# Altium footprint library PcbLib1.PcbLib: 102 footprints (part 6 of 7)
Each footprint in its own frame and in the unit in brackets; x right, y up, seen from the top. Pads: shape width x height; smd on the part's side, far side on the other; paste and mask are expansions set on the pad; w line width, h text height; cw(c..) or ccw(c..) is an arc to the next point about the centre after c.
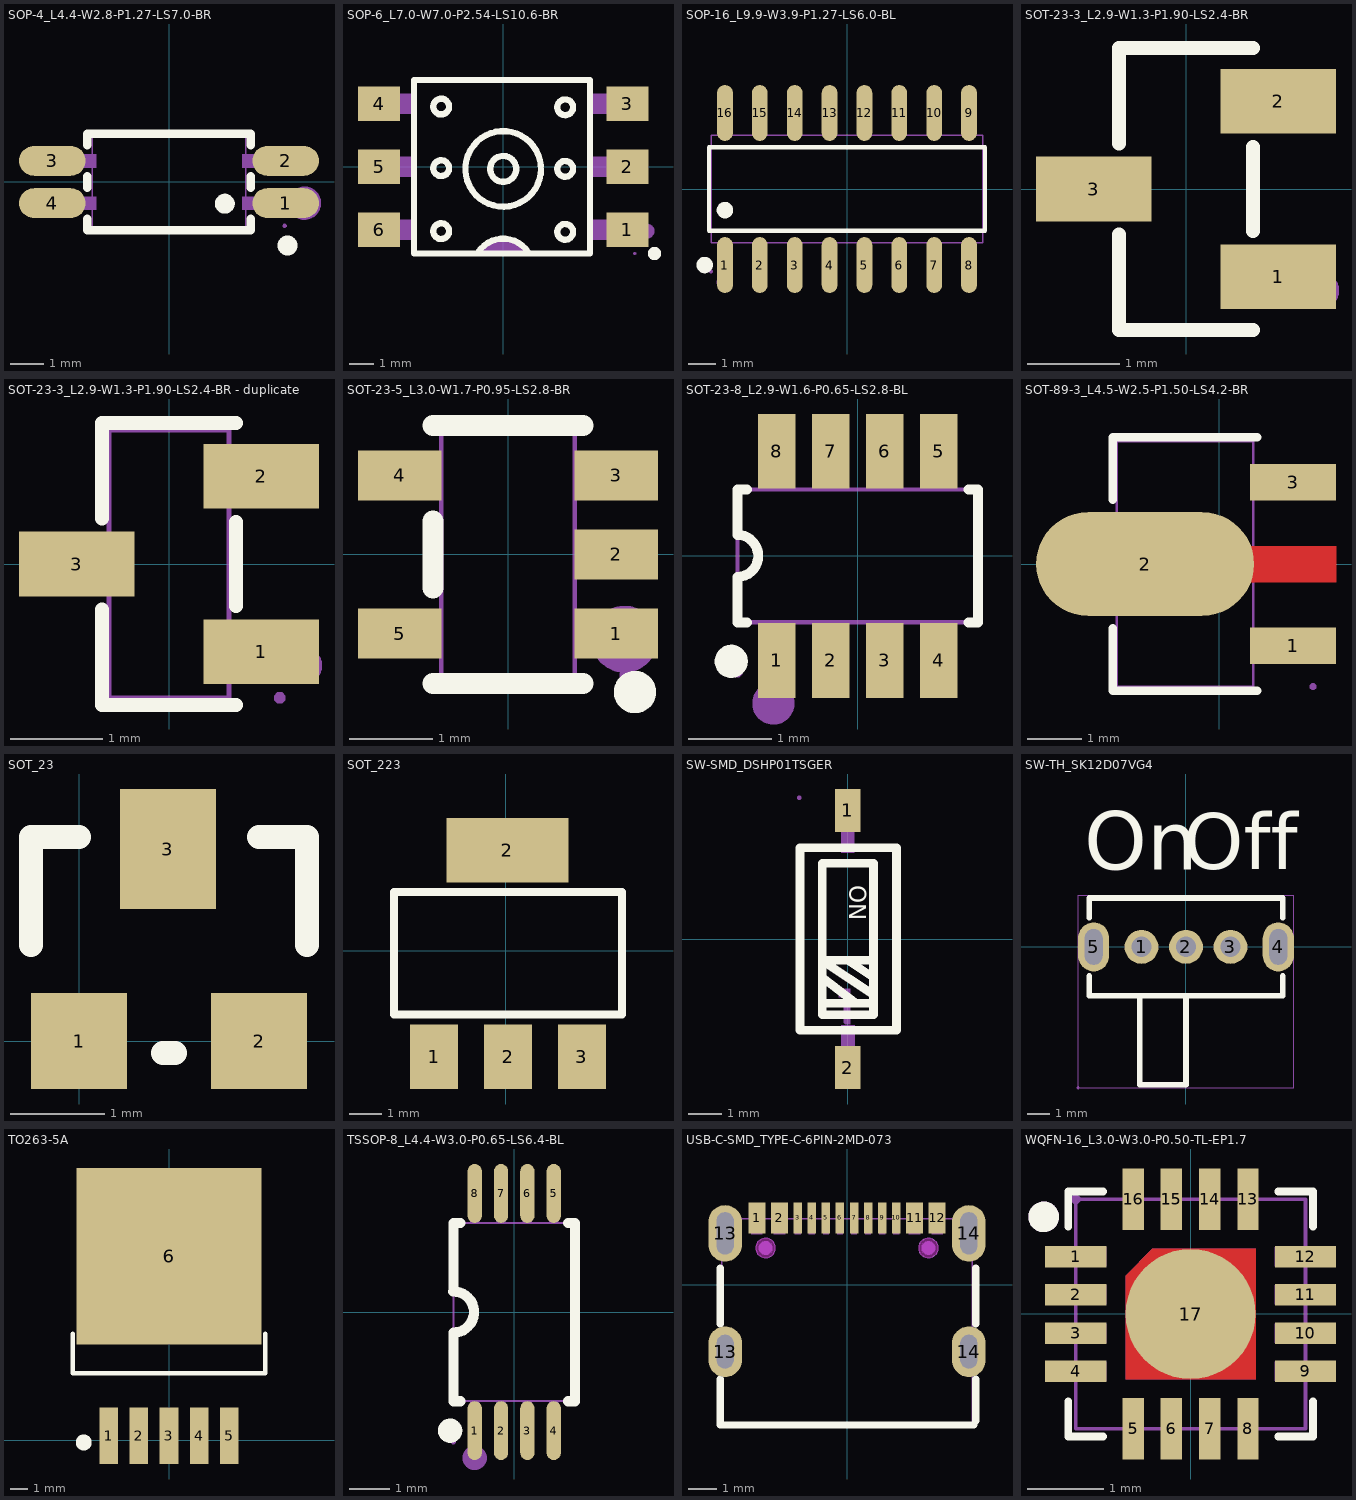
[diagram p5: the footprints below, top view; thin cyan lines are the x and y axes]

## SOP-4_L4.4-W2.8-P1.27-LS7.0-BR [mm]
pads (4):
  oval 2x0.9 smd mask+0.051: 1(3.5,-0.635) 2(3.5,0.635) 3(-3.5,0.635) 4(-3.5,-0.635)
Top Overlay:
  lines w0.254: -2.45,-1.097 -2.45,-1.45 2.45,-1.45 2.45,-1.096 ; -2.45,-0.174 -2.45,0.173 ; -2.45,1.096 -2.45,1.45 2.45,1.45 2.45,1.096 ; 2.45,-0.174 2.45,0.174
  lines w0.3: 1.672,-0.801 cw(c1.673,-0.651) 1.674,-0.801 ; 3.555,-2.055 cw(c3.556,-1.905) 3.557,-2.055
Mechanical 6:
  circle w0.5: c4.064,-0.635 r0.25
Mechanical 15:
  region: 3.53,-1.32 3.53,-1.295 3.495,-1.26 3.445,-1.26 3.41,-1.295 3.41,-1.32 3.41,-1.345 3.445,-1.38 3.495,-1.38 3.53,-1.345 3.53,-1.32
  region: -2.81,-0.835 -2.81,-0.435 -2.19,-0.435 -2.19,-0.835
  region: -3.5,-0.835 -3.5,-0.435 -2.8,-0.435 -2.8,-0.835
  region: -2.81,0.435 -2.81,0.835 -2.19,0.835 -2.19,0.435
  region: -3.5,0.435 -3.5,0.835 -2.8,0.835 -2.8,0.435
  region: 2.19,0.435 2.19,0.835 2.81,0.835 2.81,0.435
  region: 2.8,0.435 2.8,0.835 3.5,0.835 3.5,0.435
  region: 2.19,-0.835 2.19,-0.435 2.81,-0.435 2.81,-0.835
  region: 2.8,-0.835 2.8,-0.435 3.5,-0.435 3.5,-0.835
  lines w0.051: -2.3,-1.35 -2.3,1.35 2.3,1.35 2.3,-1.35 -2.3,-1.35

## SOP-6_L7.0-W7.0-P2.54-LS10.6-BR [mm]
pads (6):
  rect 1.7x1.4 smd mask+0.05: 1(5.005,-2.54) 2(5.005,0) 3(5.005,2.54) 4(-5.005,2.54) 5(-5.005,0) 6(-5.005,-2.54)
Top Overlay:
  circle w0.254: c6.1,-3.5 r0.141
  circle w0.254: c-2.5,-2.6 r0.318
  circle w0.254: c-2.5,-0.06 r0.318
  circle w0.254: c-2.5,2.424 r0.318
  circle w0.254: c2.5,2.396 r0.318
  circle w0.254: c2.5,-0.088 r0.318
  circle w0.254: c2.5,-2.628 r0.318
  lines w0.254: -1.016,-3.465 cw(c0,-4.1) 1.016,-3.465 ; 0.468,0.146 ccw(c0,-0.088) 0.508,0.039 ; 1.519,0.039 ccw(c0,-0.088) 1.524,-0.088 ; 2.256,-3.5 3.5,-3.5 3.5,3.5 -3.6,3.5 -3.6,-3.5 -3.4,-3.5 2.451,-3.5
Mechanical 6:
  circle w0.3: c5.8,-2.6 r0.15
  region: -1.016,-3.465 -0.935,-3.336 -0.714,-3.126 -0.447,-2.978 -0.152,-2.902 0.152,-2.902 0.448,-2.978 0.714,-3.126 0.935,-3.336 1.016,-3.465
Mechanical 15:
  region: 5.36,-3.5 5.36,-3.475 5.325,-3.44 5.275,-3.44 5.24,-3.475 5.24,-3.5 5.24,-3.525 5.275,-3.56 5.325,-3.56 5.36,-3.525 5.36,-3.5
  region: -4.51,-2.94 -4.51,-2.14 -3.49,-2.14 -3.49,-2.94
  region: -5.3,-2.94 -5.3,-2.14 -4.5,-2.14 -4.5,-2.94
  region: -4.51,-0.4 -4.51,0.4 -3.49,0.4 -3.49,-0.4
  region: -5.3,-0.4 -5.3,0.4 -4.5,0.4 -4.5,-0.4
  region: -4.51,2.14 -4.51,2.94 -3.49,2.94 -3.49,2.14
  region: -5.3,2.14 -5.3,2.94 -4.5,2.94 -4.5,2.14
  region: 3.49,2.14 3.49,2.94 4.51,2.94 4.51,2.14
  region: 4.5,2.14 4.5,2.94 5.3,2.94 5.3,2.14
  region: 3.49,-0.4 3.49,0.4 4.51,0.4 4.51,-0.4
  region: 4.5,-0.4 4.5,0.4 5.3,0.4 5.3,-0.4
  region: 3.49,-2.94 3.49,-2.14 4.51,-2.14 4.51,-2.94
  region: 4.5,-2.94 4.5,-2.14 5.3,-2.14 5.3,-2.94
  lines w0.051: -3.5,-3.5 -3.5,3.5 3.5,3.5 3.5,-3.5 -3.5,-3.5

## SOP-16_L9.9-W3.9-P1.27-LS6.0-BL [mm] "MAX3232"
pads (16):
  oval 0.574x2.038 smd: 1(-4.445,-2.769) 2(-3.175,-2.769) 3(-1.905,-2.769) 4(-0.635,-2.769) 5(0.635,-2.769) 6(1.905,-2.769) 7(3.175,-2.769) 8(4.445,-2.769) 9(4.445,2.769) 10(3.175,2.769) 11(1.905,2.769) 12(0.635,2.769) 13(-0.635,2.769) 14(-1.905,2.769) 15(-3.175,2.769) 16(-4.445,2.769)
Top Overlay:
  circle w0.3: c-5.184,-2.769 r0.15
  circle w0.3: c-4.445,-0.769 r0.15
  lines w0.152: -5.026,-1.521 5.026,-1.521 5.026,1.521 -5.026,1.521 -5.026,-1.521
Mechanical 6:
  circle w0.3: c-4.445,-3.4 r0.15
Mechanical 15:
  drawing of 37 lines, arcs and shapes, not listed
3D body "SOP-16.STEP": height 1.59, standoff 0.03, extent -4.95,-3 4.95,3

## SOT-23-3_L2.9-W1.3-P1.90-LS2.4-BR [mm] "静电放电(ESD)保护器件"
pads (3):
  rect 1.25x0.7 smd: 1(1,-0.95) 2(1,0.95) 3(-1,0)
Top Overlay:
  lines w0.152: -0.726,-0.495 -0.726,-1.526 0.726,-1.526 ; -0.726,0.495 -0.726,1.526 0.726,1.526 ; 0.726,-0.455 0.726,0.455
Mechanical 15:
  circle w0.2: c1.46,-1.1 r0.1
3D body "SOT-23-3.STEP": height 1.2, standoff 0, extent -1.4,-1.45 1.4,1.45

## SOT-23-3_L2.9-W1.3-P1.90-LS2.4-BR - duplicate [mm]
pads (3):
  rect 1.25x0.7 smd: 1(1,-0.95) 2(1,0.95) 3(-1,0)
Top Overlay:
  lines w0.152: -0.726,-0.495 -0.726,-1.526 0.726,-1.526 ; -0.726,0.495 -0.726,1.526 0.726,1.526 ; 0.726,-0.455 0.726,0.455
Mechanical 6:
  circle w0.2: c1.46,-1.1 r0.1
Mechanical 15:
  region: -1.2,-0.215 -1.2,0.215 -0.9,0.215 -0.9,-0.215
  region: -0.91,-0.215 -0.91,0.215 -0.64,0.215 -0.64,-0.215
  region: 0.9,-1.165 0.9,-0.735 1.2,-0.735 1.2,-1.165
  region: 0.64,-1.165 0.64,-0.735 0.91,-0.735 0.91,-1.165
  region: 0.9,0.735 0.9,1.165 1.2,1.165 1.2,0.735
  region: 0.64,0.735 0.64,1.165 0.91,1.165 0.91,0.735
  region: 1.26,-1.45 1.26,-1.425 1.225,-1.39 1.175,-1.39 1.14,-1.425 1.14,-1.45 1.14,-1.475 1.175,-1.51 1.225,-1.51 1.26,-1.475
  lines w0.051: -0.65,-1.45 0.65,-1.45 0.65,1.45 -0.65,1.45 -0.65,-1.45

## SOT-23-5_L3.0-W1.7-P0.95-LS2.8-BR [mm]
pads (5):
  rect 1x0.6 smd: 1(1.3,-0.95) 2(1.3,0) 3(1.3,0.95) 4(-1.3,0.95) 5(-1.3,-0.95)
Top Overlay:
  circle w0.254: c1.524,-1.651 r0.127
  lines w0.254: -0.9,-1.55 0.9,-1.55 ; -0.9,-0.4 -0.9,0.4 ; -0.9,1.55 0.9,1.55
Mechanical 6:
  circle w0.4: c1.397,-1.016 r0.2
Mechanical 15:
  region: 1.46,-1.45 1.46,-1.425 1.425,-1.39 1.375,-1.39 1.34,-1.425 1.34,-1.45 1.34,-1.475 1.375,-1.51 1.425,-1.51 1.46,-1.475 1.46,-1.45
  region: 0.79,-1.15 0.79,-0.75 0.96,-0.75 0.96,-1.15
  region: 0.95,-1.15 0.95,-0.75 1.4,-0.75 1.4,-1.15
  region: 0.79,-0.2 0.79,0.2 0.96,0.2 0.96,-0.2
  region: 0.95,-0.2 0.95,0.2 1.4,0.2 1.4,-0.2
  region: 0.79,0.75 0.79,1.15 0.96,1.15 0.96,0.75
  region: 0.95,0.75 0.95,1.15 1.4,1.15 1.4,0.75
  region: -0.96,0.75 -0.96,1.15 -0.79,1.15 -0.79,0.75
  region: -1.4,0.75 -1.4,1.15 -0.95,1.15 -0.95,0.75
  region: -0.96,-1.15 -0.96,-0.75 -0.79,-0.75 -0.79,-1.15
  region: -1.4,-1.15 -1.4,-0.75 -0.95,-0.75 -0.95,-1.15
  lines w0.051: -0.8,-1.45 0.8,-1.45 0.8,1.45 -0.8,1.45 -0.8,-1.45
3D body "SOT-23-5214.STEP": height 1.2, standoff -0.05, extent -1.454,-1.456 1.559,1.444

## SOT-23-8_L2.9-W1.6-P0.65-LS2.8-BL [mm]
pads (8):
  rect 0.45x0.9 smd: 1(-0.975,-1.26) 2(-0.325,-1.26) 3(0.325,-1.26) 4(0.975,-1.26) 5(0.975,1.26) 6(0.325,1.26) 7(-0.325,1.26) 8(-0.975,1.26)
Top Overlay:
  circle w0.2: c-1.524,-1.27 r0.1
  lines w0.12: -1.451,-0.255 ccw(c-1.453,-0.001) -1.45,0.254 -1.45,0.8 -1.334,0.8 ; -1.45,-0.254 -1.45,-0.8 -1.334,-0.8 ; 1.334,-0.8 1.45,-0.8 1.45,0.8 1.334,0.8
Mechanical 6:
  circle w0.254: c-1.016,-1.778 r0.127
Mechanical 15:
  region: -1.39,-1.4 -1.39,-1.375 -1.425,-1.34 -1.475,-1.34 -1.51,-1.375 -1.51,-1.4 -1.51,-1.425 -1.475,-1.46 -1.425,-1.46 -1.39,-1.425 -1.39,-1.4
  region: -1.175,-0.96 -1.175,-0.79 -0.775,-0.79 -0.775,-0.96
  region: -1.175,-1.4 -1.175,-0.95 -0.775,-0.95 -0.775,-1.4
  region: -0.525,-0.96 -0.525,-0.79 -0.125,-0.79 -0.125,-0.96
  region: -0.525,-1.4 -0.525,-0.95 -0.125,-0.95 -0.125,-1.4
  region: 0.125,-0.96 0.125,-0.79 0.525,-0.79 0.525,-0.96
  region: 0.125,-1.4 0.125,-0.95 0.525,-0.95 0.525,-1.4
  region: 0.775,-0.96 0.775,-0.79 1.175,-0.79 1.175,-0.96
  region: 0.775,-1.4 0.775,-0.95 1.175,-0.95 1.175,-1.4
  region: 0.775,0.79 0.775,0.96 1.175,0.96 1.175,0.79
  region: 0.775,0.95 0.775,1.4 1.175,1.4 1.175,0.95
  region: 0.125,0.79 0.125,0.96 0.525,0.96 0.525,0.79
  region: 0.125,0.95 0.125,1.4 0.525,1.4 0.525,0.95
  region: -0.525,0.79 -0.525,0.96 -0.125,0.96 -0.125,0.79
  region: -0.525,0.95 -0.525,1.4 -0.125,1.4 -0.125,0.95
  region: -1.175,0.79 -1.175,0.96 -0.775,0.96 -0.775,0.79
  region: -1.175,0.95 -1.175,1.4 -0.775,1.4 -0.775,0.95
  lines w0.051: -1.45,-0.8 -1.45,0.8 1.45,0.8 1.45,-0.8 -1.45,-0.8
3D body "SOT-23-8-THIN-214.STEP": height 1.05, standoff 0, extent -1.45,-1.403 1.45,1.403

## SOT-89-3_L4.5-W2.5-P1.50-LS4.2-BR [mm]
pads (3):
  rect 1.575x0.672 smd: 1(1.356,-1.5) 3(1.356,1.5)
  oval 4x1.9 smd: 2(-1.356,0)
Top Layer:
  region: -2.283,0.95 -0.429,0.95 -0.384,0.949 -0.34,0.946 -0.296,0.94 -0.252,0.933 -0.208,0.924 -0.165,0.912 -0.123,0.899 -0.081,0.884 -0.04,0.866 0,0.847 0.04,0.826 0.078,0.803 0.115,0.779 0.151,0.752 0.185,0.724 0.219,0.695 0.251,0.664 0.281,0.631 0.31,0.597 0.337,0.562 0.362,0.525 0.386,0.488 0.408,0.449 0.428,0.409 0.447,0.33 2.144,0.33 2.144,-0.33 0.447,-0.33 0.428,-0.409 0.408,-0.449 0.386,-0.488 0.362,-0.526 0.337,-0.562 0.31,-0.597 0.281,-0.631 0.251,-0.664 0.219,-0.695 0.185,-0.725 0.151,-0.753 0.115,-0.779 0.078,-0.804 0.04,-0.827 0,-0.848 -0.04,-0.867 -0.081,-0.884 -0.123,-0.899 -0.165,-0.913 -0.208,-0.924 -0.252,-0.934 -0.296,-0.941 -0.34,-0.946 -0.384,-0.949 -0.429,-0.95 -2.283,-0.95 -2.328,-0.949 -2.372,-0.946 -2.416,-0.941 -2.46,-0.934 -2.504,-0.924 -2.547,-0.913 -2.589,-0.899 -2.631,-0.884 -2.672,-0.867 -2.713,-0.848 -2.752,-0.827 -2.79,-0.804 -2.827,-0.779 -2.863,-0.753 -2.898,-0.725 -2.931,-0.695 -2.963,-0.664 -2.993,-0.631 -3.022,-0.597 -3.049,-0.562 -3.075,-0.526 -3.098,-0.488 -3.12,-0.449 -3.141,-0.409 -3.159,-0.369 -3.175,-0.327 -3.189,-0.285 -3.202,-0.242 -3.212,-0.199 -3.22,-0.155 -3.227,-0.111 -3.231,-0.067 -3.233,-0.022 -3.233,0.022 -3.231,0.067 -3.227,0.111 -3.22,0.155 -3.212,0.199 -3.202,0.242 -3.189,0.285 -3.175,0.327 -3.159,0.369 -3.141,0.409 -3.12,0.449 -3.098,0.488 -3.075,0.525 -3.049,0.562 -3.022,0.597 -2.993,0.631 -2.963,0.664 -2.931,0.695 -2.898,0.724 -2.863,0.752 -2.827,0.779 -2.79,0.803 -2.752,0.826 -2.713,0.847 -2.672,0.866 -2.631,0.884 -2.589,0.899 -2.547,0.912 -2.504,0.924 -2.46,0.933 -2.416,0.94 -2.372,0.946 -2.328,0.949
Top Overlay:
  lines w0.152: -1.95,-1.177 -1.95,-2.326 0.702,-2.326 ; -1.95,1.177 -1.95,2.326 0.702,2.326
Mechanical 6:
  circle w0.3: c1.715,-1.5 r0.15
Mechanical 15:
  region: 1.784,-2.25 1.784,-2.225 1.749,-2.19 1.699,-2.19 1.664,-2.225 1.664,-2.25 1.664,-2.275 1.699,-2.31 1.749,-2.31 1.784,-2.275 1.784,-2.25
  region: 0.439,-0.26 1.724,-0.26 1.724,0.26 0.439,0.26 -0.136,0.863 -2,0.863 -2.471,0.288 -2.471,-0.287 -2,-0.862 -0.136,-0.862
  region: 0.624,-1.25 1.724,-1.25 1.724,-1.75 0.624,-1.75
  region: 0.624,1.75 1.724,1.75 1.724,1.25 0.624,1.25
  lines w0.051: -1.874,-2.25 -1.874,2.25 0.626,2.25 0.626,-2.25 -1.874,-2.25
3D body "SOT-89214.STEP": height 1.61, standoff 0, extent -2.431,-2.141 1.669,2.159

## SOT_23 [mil]
pads (3):
  rect 40x40 smd: 1(0,0) 2(75,0)
  rect 40x50 smd: 3(37,80)
Top Overlay:
  lines w10: -20,40 -20,85 0,85 ; 35,-5 40,-5 ; 75,85 95,85 95,40
3D body "SOT-23-3.STEP": height 47.24, standoff 0, extent -19.76,-11.65 94.42,98.59

## SOT_223 [mil]
pads (4):
  rect 59x79 smd: 1(-88,-130) 2(2.55,-130) 3(93.1,-130)
  rect 150x79 smd: 2(1.88,123.54)
Top Overlay:
  lines w10: -137.45,-78 142.55,-78 142.55,72 -137.45,72 -137.45,-78
3D body "AMS1117.step": height 73.46, standoff 0.24, extent -123,-143.78 132.91,131.78

## SW-SMD_DSHP01TSGER [mm] "1.27mm开关"
pads (2):
  rect 0.76x1.27 smd paste+0 mask+0.05: 1(0,3.81) 2(0,-3.81)
Top Overlay:
  lines w0.254: -1.417,2.7 -1.417,-2.709 1.452,-2.709 1.452,-2.662 1.443,-2.662 1.443,2.709 -1.407,2.709 ; -0.761,-1.905 0.763,-1.905 ; -0.761,-1.143 0.255,-1.905 ; 0.001,-0.635 0.763,-1.143 ; 0.763,-1.651 -0.761,-0.635 0.763,-0.635 ; -0.762,-2.25 -0.762,2.25 0.762,2.25 0.762,-2.25 -0.762,-2.25
  text "ON" at 0.047,1.59 h0.49
Mechanical 6:
  region: 0.075,-1.475 0.075,-2.525 -0.075,-2.525 -0.125,-2.475 -0.125,-1.725 -0.275,-1.725 -0.275,-1.625 -0.125,-1.475
Mechanical 15:
  region: -0.2,-4.185 -0.2,-3.385 0.2,-3.385 0.2,-4.185
  region: -0.2,3.385 -0.2,4.185 0.2,4.185 0.2,3.385
  region: 0.199,-2.554 0.201,-4.187 -0.197,-4.187 -0.197,-2.559 0.199,-2.559
  region: -0.199,2.552 -0.201,4.185 0.197,4.185 0.197,2.557 -0.199,2.557
  region: -1.38,4.185 -1.38,4.21 -1.415,4.245 -1.465,4.245 -1.5,4.21 -1.5,4.185 -1.5,4.16 -1.465,4.125 -1.415,4.125 -1.38,4.16
  lines w0.051: -1.44,-2.7 1.44,-2.7 1.44,2.7 -1.44,2.7 -1.44,-2.7
3D body "SMD,2.9x5.4mm.STEP": height 2.3, standoff -0.01, extent -1.377,-4.137 1.51,4.213

## SW-TH_SK12D07VG4 [mil]
pads (5):
  round 60 hole 36: 1(-78.74,0) 2(0,0) 3(78.74,0)
  oval 55.12x86.61 hole 31.5 slot 62.99 at 90 deg: 4(163.4,0) 5(-163.39,0)
Top Overlay:
  lines w10: -171.26,86.61 171.26,86.61 171.26,51.55 ; -171.22,-51.56 -171.22,-86.57 171.3,-86.57 ; -171.22,51.56 -171.22,86.61 ; -81.69,-86.69 -81.69,-244.09 0,-244.09 0,-86.61 ; 171.26,-86.57 171.26,-51.55
  text "On" at -179.89,102.32 h177.17
  text "Off" at -4.89,104.67 h170
Mechanical 15:
  region: -64.68,0 -64.68,2.8 -66.82,7.97 -70.77,11.92 -75.94,14.06 -81.54,14.06 -86.71,11.92 -90.66,7.97 -92.8,2.8 -92.8,0 -92.8,-2.8 -90.66,-7.97 -86.71,-11.92 -81.54,-14.06 -75.94,-14.06 -70.77,-11.92 -66.82,-7.97 -64.68,-2.8 -64.68,0
  region: 14.06,0 14.06,2.8 11.92,7.97 7.97,11.92 2.8,14.06 -2.8,14.06 -7.97,11.92 -11.92,7.97 -14.06,2.8 -14.06,0 -14.06,-2.8 -11.92,-7.97 -7.97,-11.92 -2.8,-14.06 2.8,-14.06 7.97,-11.92 11.92,-7.97 14.06,-2.8 14.06,0
  region: 92.8,0 92.8,2.8 90.66,7.97 86.71,11.92 81.54,14.06 75.94,14.06 70.77,11.92 66.82,7.97 64.68,2.8 64.68,0 64.68,-2.8 66.82,-7.97 70.77,-11.92 75.94,-14.06 81.54,-14.06 86.71,-11.92 90.66,-7.97 92.8,-2.8 92.8,0
  region: 150.78,-15.75 150.78,15.75 175.98,15.75 175.98,-15.75
  region: -175.99,-15.75 -175.99,15.75 -150.79,15.75 -150.79,-15.75
  region: -188.59,-249.09 -188.59,-248.12 -189.97,-246.73 -191.93,-246.73 -193.31,-248.12 -193.31,-249.09 -193.31,-250.07 -191.93,-251.46 -189.97,-251.46 -188.59,-250.07 -188.59,-249.09
  lines w2: -190.95,-249.09 190.95,-249.09 190.95,91.61 -190.95,91.61 -190.95,-249.09
3D body "插件,P=2mm214.STEP": height 187.01, standoff -96.22, extent -169.29,-190.94 169.29,88.62

## TO263-5A [mm] "263，5脚晶体管"
pads (6):
  rect 1.05x3.2 smd: 1(-3.4,0.254) 2(-1.7,0.254) 3(0,0.254) 4(1.7,0.254) 5(3.4,0.254)
  rect 10.45x10 smd: 6(0,10.414)
Top Overlay:
  circle w0.5: c-4.826,-0.127 r0.2
  lines w0.254: -5.461,6.037 -5.461,3.787 5.461,3.787 5.461,6.037
3D body "TO263-5A.STEP": height 4.5, standoff 0, extent -5,0.244 5,13.571

## TSSOP-8_L4.4-W3.0-P0.65-LS6.4-BL [mm]
pads (8):
  oval 0.353x1.454 smd: 1(-0.975,-2.927) 2(-0.325,-2.927) 3(0.325,-2.927) 4(0.975,-2.927) 5(0.975,2.927) 6(0.325,2.927) 7(-0.325,2.927) 8(-0.975,2.927)
Top Overlay:
  circle w0.3: c-1.581,-2.927 r0.15
  lines w0.254: -1.501,0.508 cw(c-1.501,0) -1.5,-0.508 -1.5,-2.2 -1.328,-2.2 ; -1.5,0.508 -1.5,2.2 -1.328,2.2 ; 1.328,-2.2 1.5,-2.2 1.5,2.2 1.328,2.2
Mechanical 6:
  circle w0.3: c-0.975,-3.6 r0.15
Mechanical 15:
  region: -1.44,-3.2 -1.44,-3.175 -1.475,-3.14 -1.525,-3.14 -1.56,-3.175 -1.56,-3.2 -1.56,-3.225 -1.525,-3.26 -1.475,-3.26 -1.44,-3.225 -1.44,-3.2
  region: -1.085,-3.2 -1.085,-2.7 -0.865,-2.7 -0.865,-3.2
  region: -1.085,-2.71 -1.085,-2.19 -0.865,-2.19 -0.865,-2.71
  region: -0.435,-3.2 -0.435,-2.7 -0.215,-2.7 -0.215,-3.2
  region: -0.435,-2.71 -0.435,-2.19 -0.215,-2.19 -0.215,-2.71
  region: 0.215,-3.2 0.215,-2.7 0.435,-2.7 0.435,-3.2
  region: 0.215,-2.71 0.215,-2.19 0.435,-2.19 0.435,-2.71
  region: 0.865,-3.2 0.865,-2.7 1.085,-2.7 1.085,-3.2
  region: 0.865,-2.71 0.865,-2.19 1.085,-2.19 1.085,-2.71
  region: -1.085,3.2 -1.085,2.7 -0.865,2.7 -0.865,3.2
  region: -1.085,2.71 -1.085,2.19 -0.865,2.19 -0.865,2.71
  region: -0.435,3.2 -0.435,2.7 -0.215,2.7 -0.215,3.2
  region: -0.435,2.71 -0.435,2.19 -0.215,2.19 -0.215,2.71
  region: 0.215,3.2 0.215,2.7 0.435,2.7 0.435,3.2
  region: 0.215,2.71 0.215,2.19 0.435,2.19 0.435,2.71
  region: 0.865,3.2 0.865,2.7 1.085,2.7 1.085,3.2
  region: 0.865,2.71 0.865,2.19 1.085,2.19 1.085,2.71
  lines w0.051: -1.5,-2.2 -1.5,2.2 1.5,2.2 1.5,-2.2 -1.5,-2.2
3D body "TSSOP-8214.STEP": height 1.03, standoff -0.07, extent -1.5,-3.006 1.5,3.006

## USB-C-SMD_TYPE-C-6PIN-2MD-073 [mm]
pads (16):
  rect 0.6x1.1 smd paste-100 mask+0.05: 1(-3.2,2.375) 2(-2.4,2.375) 11(2.4,2.375) 12(3.2,2.375)
  rect 0.3x1.1 smd paste-100 mask+0.05: 3(-1.75,2.375) 4(-1.25,2.375) 5(-0.75,2.375) 6(-0.25,2.375) 7(0.25,2.375) 8(0.75,2.375) 9(1.25,2.375) 10(1.75,2.375)
  oval 1.2x1.8 hole 0.6 slot 1.2 at 90 deg paste+0 mask+0.05: 13(-4.325,-2.375) 14(4.325,-2.375)
  oval 1.2x2 hole 0.6 slot 1.5 at 90 deg paste+0 mask+0.05: 13(-4.325,1.825) 14(4.325,1.825)
Top Overlay:
  lines w0.254: -4.5,-3.356 -4.5,-4.975 4.5,-4.975 ; -4.5,-1.394 -4.5,0.594 ; 4.572,-4.826 4.572,-3.353 ; 4.572,-1.397 4.572,0.597
Top Paste:
  drawing of 16 lines, arcs and shapes, not listed
Keep-Out Layer:
  board cut-out: 3.24,1.305 3.24,1.375 3.187,1.503 3.088,1.602 2.96,1.655 2.821,1.655 2.692,1.602 2.593,1.503 2.54,1.375 2.54,1.305 2.54,1.235 2.593,1.107 2.692,1.008 2.821,0.955 2.96,0.955 3.088,1.008 3.187,1.107 3.24,1.235 3.24,1.305
  board cut-out: -2.54,1.305 -2.54,1.375 -2.593,1.503 -2.692,1.602 -2.82,1.655 -2.96,1.655 -3.088,1.602 -3.187,1.503 -3.24,1.375 -3.24,1.305 -3.24,1.235 -3.187,1.107 -3.088,1.008 -2.96,0.955 -2.82,0.955 -2.692,1.008 -2.593,1.107 -2.54,1.235 -2.54,1.305
Mechanical 1:
  circle w0.005: c2.89,1.305 r0.35
  circle w0.005: c-2.89,1.305 r0.35
Mechanical 6:
  circle w0.25: c2.89,1.305 r0.125
  circle w0.25: c-2.89,1.305 r0.125
Mechanical 15:
  region: 4.2,-2.025 4.45,-2.025 4.45,-2.725 4.2,-2.725
  region: -4.45,-2.025 -4.2,-2.025 -4.2,-2.725 -4.45,-2.725
  region: 4.2,2.349 4.45,2.349 4.45,1.249 4.2,1.249
  region: -4.45,2.349 -4.2,2.349 -4.2,1.249 -4.45,1.249
  region: 3,2.649 3.4,2.649 3.4,1.799 3,1.799
  region: 2.2,2.649 2.6,2.649 2.6,1.799 2.2,1.799
  region: -2.6,2.649 -2.2,2.649 -2.2,1.799 -2.6,1.799
  region: -3.4,2.649 -3,2.649 -3,1.799 -3.4,1.799
  region: 1.65,2.649 1.85,2.649 1.85,1.799 1.65,1.799
  region: 1.15,2.649 1.35,2.649 1.35,1.799 1.15,1.799
  region: 0.65,2.649 0.85,2.649 0.85,1.799 0.65,1.799
  region: 0.15,2.649 0.35,2.649 0.35,1.799 0.15,1.799
  region: -0.35,2.649 -0.15,2.649 -0.15,1.799 -0.35,1.799
  region: -1.35,2.649 -1.15,2.649 -1.15,1.799 -1.35,1.799
  region: -0.85,2.649 -0.65,2.649 -0.65,1.799 -0.85,1.799
  region: -1.85,2.649 -1.65,2.649 -1.65,1.799 -1.85,1.799
  region: -4.39,2.649 -4.39,2.674 -4.425,2.709 -4.475,2.709 -4.51,2.674 -4.51,2.649 -4.51,2.624 -4.475,2.589 -4.425,2.589 -4.39,2.624 -4.39,2.649
  lines w0.051: -4.45,-5.001 4.45,-5.001 4.45,2.349 -4.45,2.349 -4.45,-5.001
Multi-Layer keep-out:
  region: 3.24,1.305 3.24,1.375 3.187,1.503 3.088,1.602 2.96,1.655 2.821,1.655 2.692,1.602 2.593,1.503 2.54,1.375 2.54,1.305 2.54,1.235 2.593,1.107 2.692,1.008 2.821,0.955 2.96,0.955 3.088,1.008 3.187,1.107 3.24,1.235 3.24,1.305
  region: -2.54,1.305 -2.54,1.375 -2.593,1.503 -2.692,1.602 -2.82,1.655 -2.96,1.655 -3.088,1.602 -3.187,1.503 -3.24,1.375 -3.24,1.305 -3.24,1.235 -3.187,1.107 -3.088,1.008 -2.96,0.955 -2.82,0.955 -2.692,1.008 -2.593,1.107 -2.54,1.235 -2.54,1.305
3D body "typeC214.STEP": height 3.26, standoff -0.9, extent -4.47,-5.062 4.47,2.518

## WQFN-16_L3.0-W3.0-P0.50-TL-EP1.7 [mm]
pads (17):
  rect 0.8x0.28 smd paste-100 mask+0.051: 1(-1.5,0.75) 2(-1.5,0.25) 3(-1.5,-0.25) 4(-1.5,-0.75) 9(1.5,-0.75) 10(1.5,-0.25) 11(1.5,0.25) 12(1.5,0.75)
  rect 0.28x0.8 smd paste-100 mask+0.051: 5(-0.75,-1.5) 6(-0.25,-1.5) 7(0.25,-1.5) 8(0.75,-1.5) 13(0.75,1.5) 14(0.25,1.5) 15(-0.25,1.5) 16(-0.75,1.5)
  round 1.7 smd: 17(0,0)
Top Layer:
  region: 0.85,0.85 0.85,-0.85 -0.85,-0.85 -0.85,0.5 -0.5,0.85
Top Overlay:
  circle w0.2: c-1.92,1.27 r0.1
  lines w0.102: -1.6,-1.144 -1.6,-1.6 -1.144,-1.6 ; -1.6,1.144 -1.6,1.6 -1.144,1.6 ; 1.144,-1.6 1.6,-1.6 1.6,-1.144 ; 1.144,1.6 1.6,1.6 1.6,1.144
Top Paste:
  region: 0.68,0.68 0.68,-0.68 -0.68,-0.68 -0.68,0.4 -0.4,0.68
  region: 0.89,-1.9 0.89,-1.1 0.61,-1.1 0.61,-1.9
  region: 0.39,-1.9 0.39,-1.1 0.11,-1.1 0.11,-1.9
  region: -0.11,-1.9 -0.11,-1.1 -0.39,-1.1 -0.39,-1.9
  region: -0.89,-1.1 -0.89,-1.9 -0.61,-1.9 -0.61,-1.1
  region: 1.9,-0.89 1.9,-0.61 1.1,-0.61 1.1,-0.89
  region: -1.1,-0.89 -1.1,-0.61 -1.9,-0.61 -1.9,-0.89
  region: 1.9,-0.39 1.9,-0.11 1.1,-0.11 1.1,-0.39
  region: -1.1,-0.39 -1.1,-0.11 -1.9,-0.11 -1.9,-0.39
  region: 1.9,0.11 1.9,0.39 1.1,0.39 1.1,0.11
  region: -1.1,0.11 -1.1,0.39 -1.9,0.39 -1.9,0.11
  region: 1.1,0.89 1.1,0.61 1.9,0.61 1.9,0.89
  region: -1.1,0.61 -1.1,0.89 -1.9,0.89 -1.9,0.61
  region: 0.89,1.1 0.89,1.9 0.61,1.9 0.61,1.1
  region: -0.39,1.9 -0.39,1.1 -0.11,1.1 -0.11,1.9
  region: 0.39,1.1 0.39,1.9 0.11,1.9 0.11,1.1
  region: -0.89,1.9 -0.89,1.1 -0.61,1.1 -0.61,1.9
Mechanical 6:
  circle w0.2: c-1.92,1.27 r0.1
Mechanical 15:
  region: 0.625,-1.1 0.875,-1.1 0.875,-1.5 0.625,-1.5
  region: 0.125,-1.1 0.375,-1.1 0.375,-1.5 0.125,-1.5
  region: -0.375,-1.1 -0.125,-1.1 -0.125,-1.5 -0.375,-1.5
  region: 0.85,0.85 0.85,-0.85 -0.85,-0.85 -0.85,0.5 -0.5,0.85
  region: -0.875,-1.1 -0.625,-1.1 -0.625,-1.5 -0.875,-1.5
  region: -1.1,0.875 -1.1,0.625 -1.5,0.625 -1.5,0.875
  region: -1.1,0.375 -1.1,0.125 -1.5,0.125 -1.5,0.375
  region: -1.1,-0.125 -1.1,-0.375 -1.5,-0.375 -1.5,-0.125
  region: -1.1,-0.625 -1.1,-0.875 -1.5,-0.875 -1.5,-0.625
  region: 0.875,1.1 0.625,1.1 0.625,1.5 0.875,1.5
  region: 0.375,1.1 0.125,1.1 0.125,1.5 0.375,1.5
  region: -0.125,1.1 -0.375,1.1 -0.375,1.5 -0.125,1.5
  region: -0.625,1.1 -0.875,1.1 -0.875,1.5 -0.625,1.5
  region: 1.1,0.625 1.1,0.875 1.5,0.875 1.5,0.625
  region: 1.1,0.125 1.1,0.375 1.5,0.375 1.5,0.125
  region: 1.1,-0.375 1.1,-0.125 1.5,-0.125 1.5,-0.375
  region: 1.1,-0.875 1.1,-0.625 1.5,-0.625 1.5,-0.875
  region: -1.44,1.5 -1.44,1.525 -1.475,1.56 -1.525,1.56 -1.56,1.525 -1.56,1.5 -1.56,1.475 -1.525,1.44 -1.475,1.44 -1.44,1.475 -1.44,1.5
  lines w0.051: -1.5,-1.5 1.5,-1.5 1.5,1.5 -1.5,1.5 -1.5,-1.5
3D body "WQFN-16(3x3)214.STEP": height 0.76, standoff -0.04, extent -1.5,-1.5 1.5,1.5